# Altium footprint library FPC_FFC_Connectors.PcbLib: 27 footprints (part 2 of 2)
Each footprint in its own frame and in the unit in brackets; x right, y up, seen from the top. Pads: shape width x height; smd on the part's side, far side on the other; paste and mask are expansions set on the pad; w line width, h text height; cw(c..) or ccw(c..) is an arc to the next point about the centre after c.
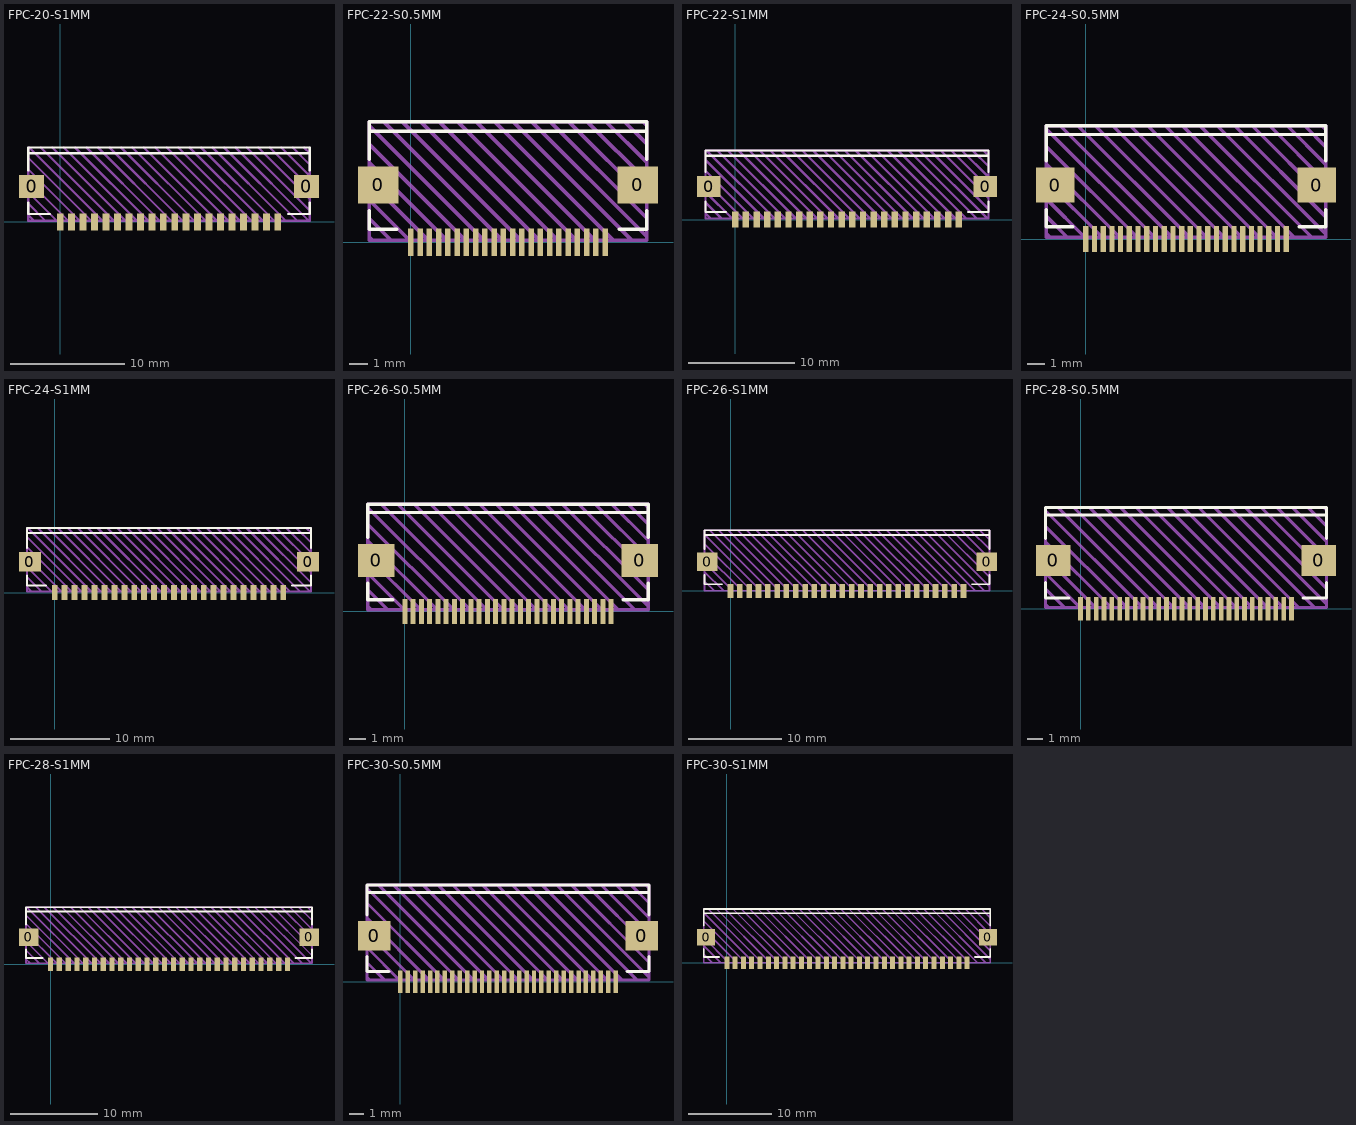
[diagram p1: the footprints below, top view; thin cyan lines are the x and y axes]

## FPC-20-S1MM [mm]
pads (22):
  rect 2.2x2 smd: 0(-2.5,3.1) 0(21.5,3.1)
  rect 0.6x1.5 smd: 1(0,0) 2(1,0) 3(2,0) 4(3,0) 5(4,0) 6(5,0) 7(6,0) 8(7,0) 9(8,0) 10(9,0) 11(10,0) 12(11,0) 13(12,0) 14(13,0) 15(14,0) 16(15,0) 17(16,0) 18(17,0) 19(18,0) 20(19,0)
Top Overlay:
  lines w0.2: -2.8,1.7 -2.8,0.7 -0.9,0.7 ; -2.8,4.5 -2.8,6.5 21.8,6.5 21.8,4.5 ; -2.8,6 21.8,6 ; 19.9,0.7 21.8,0.7 21.8,1.7
Top Draw:
  lines w0.2: -2.8,0.6 -2.3,0.1 ; -2.8,1.6 -1.3,0.1 ; -2.8,2.6 -0.3,0.1 ; -2.8,3.6 0.7,0.1 ; -2.8,4.6 1.7,0.1 ; -2.8,5.6 2.7,0.1 ; -2.8,6.5 -2.8,0.1 21.8,0.1 21.8,6.5 ; -2.7,6.5 3.7,0.1 ; -1.7,6.5 4.7,0.1 ; -0.7,6.5 5.7,0.1 ; 0.3,6.5 6.7,0.1 ; 1.3,6.5 7.7,0.1 ; 2.3,6.5 8.7,0.1 ; 3.3,6.5 9.7,0.1 ; 4.3,6.5 10.7,0.1 ; 5.3,6.5 11.7,0.1 ; 6.3,6.5 12.7,0.1 ; 7.3,6.5 13.7,0.1 ; 8.3,6.5 14.7,0.1 ; 9.3,6.5 15.7,0.1 ; 10.3,6.5 16.7,0.1 ; 11.3,6.5 17.7,0.1 ; 12.3,6.5 18.7,0.1 ; 13.3,6.5 19.7,0.1 ; 14.3,6.5 20.7,0.1 ; 15.3,6.5 21.7,0.1 ; 16.3,6.5 21.8,1 ; 17.3,6.5 21.8,2 ; 18.3,6.5 21.8,3 ; 19.3,6.5 21.8,4 ; 20.3,6.5 21.8,5 ; 21.3,6.5 21.8,6
Top Info:
  text "'.Comment'" at 5.251,-2.283 h1
3D body "686120148922 (rev1).stp": height 2.25, standoff 0, extent -2.8,0.05 21.8,6.55

## FPC-22-S0.5MM [mm]
pads (24):
  rect 2.2x2 smd: 0(-1.75,3.1) 0(12.25,3.1)
  rect 0.3x1.5 smd: 1(0,0) 2(0.5,0) 3(1,0) 4(1.5,0) 5(2,0) 6(2.5,0) 7(3,0) 8(3.5,0) 9(4,0) 10(4.5,0) 11(5,0) 12(5.5,0) 13(6,0) 14(6.5,0) 15(7,0) 16(7.5,0) 17(8,0) 18(8.5,0) 19(9,0) 20(9.5,0) 21(10,0) 22(10.5,0)
Top Overlay:
  lines w0.2: -2.25,1.7 -2.25,0.7 -0.75,0.7 ; -2.25,4.5 -2.25,6.5 12.75,6.5 12.75,4.5 ; -2.25,6 12.75,6 ; 11.25,0.7 12.75,0.7 12.75,1.7
Top Draw:
  lines w0.2: -2.25,0.3 -2.05,0.1 ; -2.25,1.3 -1.05,0.1 ; -2.25,2.3 -0.05,0.1 ; -2.25,3.3 0.95,0.1 ; -2.25,4.3 1.95,0.1 ; -2.25,5.3 2.95,0.1 ; -2.25,6.3 3.95,0.1 ; -1.45,6.5 4.95,0.1 ; -0.45,6.5 5.95,0.1 ; 0.55,6.5 6.95,0.1 ; 1.55,6.5 7.95,0.1 ; 2.55,6.5 8.95,0.1 ; 3.55,6.5 9.95,0.1 ; 4.55,6.5 10.95,0.1 ; 5.55,6.5 11.95,0.1 ; 6.55,6.5 12.75,0.3 ; 7.55,6.5 12.75,1.3 ; 8.55,6.5 12.75,2.3 ; 9.55,6.5 12.75,3.3 ; 10.55,6.5 12.75,4.3 ; 11.55,6.5 12.75,5.3 ; 12.55,6.5 12.75,6.3 ; -2.25,0.1 -2.25,6.5 12.75,6.5 12.75,0.1 -2.25,0.1
Top Info:
  text "'.Comment'" at 1.001,-2.283 h1
3D body "687122149022 (rev1).stp": height 2.25, standoff 0, extent -2.3,0.05 12.8,6.55

## FPC-22-S1MM [mm]
pads (24):
  rect 2.2x2 smd: 0(-2.5,3.1) 0(23.5,3.1)
  rect 0.6x1.5 smd: 1(0,0) 2(1,0) 3(2,0) 4(3,0) 5(4,0) 6(5,0) 7(6,0) 8(7,0) 9(8,0) 10(9,0) 11(10,0) 12(11,0) 13(12,0) 14(13,0) 15(14,0) 16(15,0) 17(16,0) 18(17,0) 19(18,0) 20(19,0) 21(20,0) 22(21,0)
Top Overlay:
  lines w0.2: -2.8,1.7 -2.8,0.7 -0.9,0.7 ; -2.8,4.5 -2.8,6.5 23.8,6.5 23.8,4.5 ; -2.8,6 23.8,6 ; 21.9,0.7 23.8,0.7 23.8,1.7
Top Draw:
  lines w0.2: -2.8,0.6 -2.3,0.1 ; -2.8,1.6 -1.3,0.1 ; -2.8,2.6 -0.3,0.1 ; -2.8,3.6 0.7,0.1 ; -2.8,4.6 1.7,0.1 ; -2.8,5.6 2.7,0.1 ; -2.7,6.5 3.7,0.1 ; -1.7,6.5 4.7,0.1 ; -0.7,6.5 5.7,0.1 ; 0.3,6.5 6.7,0.1 ; 1.3,6.5 7.7,0.1 ; 2.3,6.5 8.7,0.1 ; 3.3,6.5 9.7,0.1 ; 4.3,6.5 10.7,0.1 ; 5.3,6.5 11.7,0.1 ; 6.3,6.5 12.7,0.1 ; 7.3,6.5 13.7,0.1 ; 8.3,6.5 14.7,0.1 ; 9.3,6.5 15.7,0.1 ; 10.3,6.5 16.7,0.1 ; 11.3,6.5 17.7,0.1 ; 12.3,6.5 18.7,0.1 ; 13.3,6.5 19.7,0.1 ; 14.3,6.5 20.7,0.1 ; 15.3,6.5 21.7,0.1 ; 16.3,6.5 22.7,0.1 ; 17.3,6.5 23.7,0.1 ; 18.3,6.5 23.8,1 ; 19.3,6.5 23.8,2 ; 20.3,6.5 23.8,3 ; 21.3,6.5 23.8,4 ; 22.3,6.5 23.8,5 ; 23.3,6.5 23.8,6 ; -2.8,0.1 23.8,0.1 23.8,6.5 -2.8,6.5 -2.8,0.1
Top Info:
  text "'.Comment'" at 6.251,-2.283 h1
3D body "686122148922 (rev1).stp": height 2.25, standoff 0, extent -2.8,0.05 23.8,6.55

## FPC-24-S0.5MM [mm]
pads (26):
  rect 2.2x2 smd: 0(-1.75,3.1) 0(13.25,3.1)
  rect 0.3x1.5 smd: 1(0,0) 2(0.5,0) 3(1,0) 4(1.5,0) 5(2,0) 6(2.5,0) 7(3,0) 8(3.5,0) 9(4,0) 10(4.5,0) 11(5,0) 12(5.5,0) 13(6,0) 14(6.5,0) 15(7,0) 16(7.5,0) 17(8,0) 18(8.5,0) 19(9,0) 20(9.5,0) 21(10,0) 22(10.5,0) 23(11,0) 24(11.5,0)
Top Overlay:
  lines w0.2: -2.25,1.7 -2.25,0.7 -0.75,0.7 ; -2.25,4.5 -2.25,6.5 13.75,6.5 13.75,4.5 ; -2.25,6 13.75,6 ; 12.25,0.7 13.75,0.7 13.75,1.7
Top Draw:
  lines w0.2: -2.25,0.3 -2.05,0.1 ; -2.25,1.3 -1.05,0.1 ; -2.25,2.3 -0.05,0.1 ; -2.25,3.3 0.95,0.1 ; -2.25,4.3 1.95,0.1 ; -2.25,5.3 2.95,0.1 ; -2.25,6.3 3.95,0.1 ; -1.45,6.5 4.95,0.1 ; -0.45,6.5 5.95,0.1 ; 0.55,6.5 6.95,0.1 ; 1.55,6.5 7.95,0.1 ; 2.55,6.5 8.95,0.1 ; 3.55,6.5 9.95,0.1 ; 4.55,6.5 10.95,0.1 ; 5.55,6.5 11.95,0.1 ; 6.55,6.5 12.95,0.1 ; 7.55,6.5 13.75,0.3 ; 8.55,6.5 13.75,1.3 ; 9.55,6.5 13.75,2.3 ; 10.55,6.5 13.75,3.3 ; 11.55,6.5 13.75,4.3 ; 12.55,6.5 13.75,5.3 ; 13.55,6.5 13.75,6.3 ; -2.25,0.1 -2.25,6.5 13.75,6.5 13.75,0.1 -2.25,0.1
Top Info:
  text "'.Comment'" at 1.501,-2.283 h1
3D body "687124149022 (rev1).stp": height 2.25, standoff 0, extent -2.3,0.05 13.8,6.55

## FPC-24-S1MM [mm]
pads (26):
  rect 2.2x2 smd: 0(-2.5,3.1) 0(25.5,3.1)
  rect 0.6x1.5 smd: 1(0,0) 2(1,0) 3(2,0) 4(3,0) 5(4,0) 6(5,0) 7(6,0) 8(7,0) 9(8,0) 10(9,0) 11(10,0) 12(11,0) 13(12,0) 14(13,0) 15(14,0) 16(15,0) 17(16,0) 18(17,0) 19(18,0) 20(19,0) 21(20,0) 22(21,0) 23(22,0) 24(23,0)
Top Overlay:
  lines w0.2: -2.8,1.7 -2.8,0.7 -0.9,0.7 ; -2.8,4.5 -2.8,6.5 25.8,6.5 25.8,4.5 ; -2.8,6 25.8,6 ; 23.9,0.7 25.8,0.7 25.8,1.7
Top Draw:
  lines w0.2: -2.8,0.6 -2.3,0.1 ; -2.8,1.6 -1.3,0.1 ; -2.8,2.6 -0.3,0.1 ; -2.8,3.6 0.7,0.1 ; -2.8,4.6 1.7,0.1 ; -2.8,5.6 2.7,0.1 ; -2.7,6.5 3.7,0.1 ; -1.7,6.5 4.7,0.1 ; -0.7,6.5 5.7,0.1 ; 0.3,6.5 6.7,0.1 ; 1.3,6.5 7.7,0.1 ; 2.3,6.5 8.7,0.1 ; 3.3,6.5 9.7,0.1 ; 4.3,6.5 10.7,0.1 ; 5.3,6.5 11.7,0.1 ; 6.3,6.5 12.7,0.1 ; 7.3,6.5 13.7,0.1 ; 8.3,6.5 14.7,0.1 ; 9.3,6.5 15.7,0.1 ; 10.3,6.5 16.7,0.1 ; 11.3,6.5 17.7,0.1 ; 12.3,6.5 18.7,0.1 ; 13.3,6.5 19.7,0.1 ; 14.3,6.5 20.7,0.1 ; 15.3,6.5 21.7,0.1 ; 16.3,6.5 22.7,0.1 ; 17.3,6.5 23.7,0.1 ; 18.3,6.5 24.7,0.1 ; 19.3,6.5 25.7,0.1 ; 20.3,6.5 25.8,1 ; 21.3,6.5 25.8,2 ; 22.3,6.5 25.8,3 ; 23.3,6.5 25.8,4 ; 24.3,6.5 25.8,5 ; 25.3,6.5 25.8,6 ; -2.8,0.1 -2.8,6.5 25.8,6.5 25.8,0.1 -2.8,0.1
Top Info:
  text "'.Comment'" at 7.251,-2.283 h1
3D body "686124148922 (rev1).stp": height 2.25, standoff 0, extent -2.8,0.05 25.8,6.55

## FPC-26-S0.5MM [mm]
pads (28):
  rect 2.2x2 smd: 0(-1.75,3.1) 0(14.25,3.1)
  rect 0.3x1.5 smd: 1(0,0) 2(0.5,0) 3(1,0) 4(1.5,0) 5(2,0) 6(2.5,0) 7(3,0) 8(3.5,0) 9(4,0) 10(4.5,0) 11(5,0) 12(5.5,0) 13(6,0) 14(6.5,0) 15(7,0) 16(7.5,0) 17(8,0) 18(8.5,0) 19(9,0) 20(9.5,0) 21(10,0) 22(10.5,0) 23(11,0) 24(11.5,0) 25(12,0) 26(12.5,0)
Top Overlay:
  lines w0.2: -2.25,1.7 -2.25,0.7 -0.75,0.7 ; -2.25,4.5 -2.25,6.5 14.75,6.5 14.75,4.5 ; -2.25,6 14.75,6 ; 13.25,0.7 14.75,0.7 14.75,1.7
Top Draw:
  lines w0.2: -2.25,0.3 -2.05,0.1 ; -2.25,1.3 -1.05,0.1 ; -2.25,2.3 -0.05,0.1 ; -2.25,3.3 0.95,0.1 ; -2.25,4.3 1.95,0.1 ; -2.25,5.3 2.95,0.1 ; -2.25,6.3 3.95,0.1 ; -1.45,6.5 4.95,0.1 ; -0.45,6.5 5.95,0.1 ; 0.55,6.5 6.95,0.1 ; 1.55,6.5 7.95,0.1 ; 2.55,6.5 8.95,0.1 ; 3.55,6.5 9.95,0.1 ; 4.55,6.5 10.95,0.1 ; 5.55,6.5 11.95,0.1 ; 6.55,6.5 12.95,0.1 ; 7.55,6.5 13.95,0.1 ; 8.55,6.5 14.75,0.3 ; 9.55,6.5 14.75,1.3 ; 10.55,6.5 14.75,2.3 ; 11.55,6.5 14.75,3.3 ; 12.55,6.5 14.75,4.3 ; 13.55,6.5 14.75,5.3 ; 14.55,6.5 14.75,6.3 ; -2.25,0.1 -2.25,6.5 14.75,6.5 14.75,0.1 -2.25,0.1
Top Info:
  text "'.Comment'" at 2.001,-2.283 h1
3D body "687126149022 (rev1).stp": height 2.25, standoff 0, extent -2.3,0.05 14.8,6.55

## FPC-26-S1MM [mm]
pads (28):
  rect 2.2x2 smd: 0(-2.5,3.1) 0(27.5,3.1)
  rect 0.6x1.5 smd: 1(0,0) 2(1,0) 3(2,0) 4(3,0) 5(4,0) 6(5,0) 7(6,0) 8(7,0) 9(8,0) 10(9,0) 11(10,0) 12(11,0) 13(12,0) 14(13,0) 15(14,0) 16(15,0) 17(16,0) 18(17,0) 19(18,0) 20(19,0) 21(20,0) 22(21,0) 23(22,0) 24(23,0) 25(24,0) 26(25,0)
Top Overlay:
  lines w0.2: -2.8,1.7 -2.8,0.7 -0.9,0.7 ; -2.8,4.5 -2.8,6.5 27.8,6.5 27.8,4.5 ; -2.8,6 27.8,6 ; 25.9,0.7 27.8,0.7 27.8,1.7
Top Draw:
  lines w0.2: -2.8,0.05 -2.75,0 ; -2.8,1.05 -1.75,0 ; -2.8,2.05 -0.75,0 ; -2.8,3.05 0.25,0 ; -2.8,4.05 1.25,0 ; -2.8,5.05 2.25,0 ; -2.8,6.05 3.25,0 ; -2.25,6.5 4.25,0 ; -1.25,6.5 5.25,0 ; -0.25,6.5 6.25,0 ; 0.75,6.5 7.25,0 ; 1.75,6.5 8.25,0 ; 2.75,6.5 9.25,0 ; 3.75,6.5 10.25,0 ; 4.75,6.5 11.25,0 ; 5.75,6.5 12.25,0 ; 6.75,6.5 13.25,0 ; 7.75,6.5 14.25,0 ; 8.75,6.5 15.25,0 ; 9.75,6.5 16.25,0 ; 10.75,6.5 17.25,0 ; 11.75,6.5 18.25,0 ; 12.75,6.5 19.25,0 ; 13.75,6.5 20.25,0 ; 14.75,6.5 21.25,0 ; 15.75,6.5 22.25,0 ; 16.75,6.5 23.25,0 ; 17.75,6.5 24.25,0 ; 18.75,6.5 25.25,0 ; 19.75,6.5 26.25,0 ; 20.75,6.5 27.25,0 ; 21.75,6.5 27.8,0.45 ; 22.75,6.5 27.8,1.45 ; 23.75,6.5 27.8,2.45 ; 24.75,6.5 27.8,3.45 ; 25.75,6.5 27.8,4.45 ; 26.75,6.5 27.8,5.45 ; 27.75,6.5 27.8,6.45 ; -2.8,0 27.8,0 27.8,6.5 -2.8,6.5 -2.8,0
Top Info:
  text "'.Comment'" at 8.251,-2.283 h1
3D body "686126148922 (rev1).stp": height 2.25, standoff 0, extent -2.8,-0.05 27.8,6.45

## FPC-28-S0.5MM [mm]
pads (30):
  rect 2.2x2 smd: 0(-1.75,3.1) 0(15.25,3.1)
  rect 0.3x1.5 smd: 1(0,0) 2(0.5,0) 3(1,0) 4(1.5,0) 5(2,0) 6(2.5,0) 7(3,0) 8(3.5,0) 9(4,0) 10(4.5,0) 11(5,0) 12(5.5,0) 13(6,0) 14(6.5,0) 15(7,0) 16(7.5,0) 17(8,0) 18(8.5,0) 19(9,0) 20(9.5,0) 21(10,0) 22(10.5,0) 23(11,0) 24(11.5,0) 25(12,0) 26(12.5,0) 27(13,0) 28(13.5,0)
Top Overlay:
  lines w0.2: -2.25,1.7 -2.25,0.7 -0.75,0.7 ; -2.25,4.5 -2.25,6.5 15.75,6.5 15.75,4.5 ; -2.25,6 15.75,6 ; 14.25,0.7 15.75,0.7 15.75,1.7
Top Draw:
  lines w0.2: -2.25,0.3 -2.05,0.1 ; -2.25,1.3 -1.05,0.1 ; -2.25,2.3 -0.05,0.1 ; -2.25,3.3 0.95,0.1 ; -2.25,4.3 1.95,0.1 ; -2.25,5.3 2.95,0.1 ; -2.25,6.3 3.95,0.1 ; -1.45,6.5 4.95,0.1 ; -0.45,6.5 5.95,0.1 ; 0.55,6.5 6.95,0.1 ; 1.55,6.5 7.95,0.1 ; 2.55,6.5 8.95,0.1 ; 3.55,6.5 9.95,0.1 ; 4.55,6.5 10.95,0.1 ; 5.55,6.5 11.95,0.1 ; 6.55,6.5 12.95,0.1 ; 7.55,6.5 13.95,0.1 ; 8.55,6.5 14.95,0.1 ; 9.55,6.5 15.75,0.3 ; 10.55,6.5 15.75,1.3 ; 11.55,6.5 15.75,2.3 ; 12.55,6.5 15.75,3.3 ; 13.55,6.5 15.75,4.3 ; 14.55,6.5 15.75,5.3 ; 15.55,6.5 15.75,6.3 ; -2.25,0.1 15.75,0.1 15.75,6.5 -2.25,6.5 -2.25,0.1
Top Info:
  text "'.Comment'" at 2.501,-2.283 h1
3D body "687128149022 (rev1).stp": height 2.25, standoff 0, extent -2.3,0.05 15.8,6.55

## FPC-28-S1MM [mm]
pads (30):
  rect 2.2x2 smd: 0(-2.5,3.1) 0(29.5,3.1)
  rect 0.6x1.5 smd: 1(0,0) 2(1,0) 3(2,0) 4(3,0) 5(4,0) 6(5,0) 7(6,0) 8(7,0) 9(8,0) 10(9,0) 11(10,0) 12(11,0) 13(12,0) 14(13,0) 15(14,0) 16(15,0) 17(16,0) 18(17,0) 19(18,0) 20(19,0) 21(20,0) 22(21,0) 23(22,0) 24(23,0) 25(24,0) 26(25,0) 27(26,0) 28(27,0)
Top Overlay:
  lines w0.2: -2.8,1.7 -2.8,0.7 -0.9,0.7 ; -2.8,4.5 -2.8,6.5 29.8,6.5 29.8,4.5 ; -2.8,6 29.8,6 ; 27.9,0.7 29.8,0.7 29.8,1.7
Top Draw:
  lines w0.2: -2.8,0.6 -2.3,0.1 ; -2.8,1.6 -1.3,0.1 ; -2.8,2.6 -0.3,0.1 ; -2.8,3.6 0.7,0.1 ; -2.8,4.6 1.7,0.1 ; -2.8,5.6 2.7,0.1 ; -2.7,6.5 3.7,0.1 ; -1.7,6.5 4.7,0.1 ; -0.7,6.5 5.7,0.1 ; 0.3,6.5 6.7,0.1 ; 1.3,6.5 7.7,0.1 ; 2.3,6.5 8.7,0.1 ; 3.3,6.5 9.7,0.1 ; 4.3,6.5 10.7,0.1 ; 5.3,6.5 11.7,0.1 ; 6.3,6.5 12.7,0.1 ; 7.3,6.5 13.7,0.1 ; 8.3,6.5 14.7,0.1 ; 9.3,6.5 15.7,0.1 ; 10.3,6.5 16.7,0.1 ; 11.3,6.5 17.7,0.1 ; 12.3,6.5 18.7,0.1 ; 13.3,6.5 19.7,0.1 ; 14.3,6.5 20.7,0.1 ; 15.3,6.5 21.7,0.1 ; 16.3,6.5 22.7,0.1 ; 17.3,6.5 23.7,0.1 ; 18.3,6.5 24.7,0.1 ; 19.3,6.5 25.7,0.1 ; 20.3,6.5 26.7,0.1 ; 21.3,6.5 27.7,0.1 ; 22.3,6.5 28.7,0.1 ; 23.3,6.5 29.7,0.1 ; 24.3,6.5 29.8,1 ; 25.3,6.5 29.8,2 ; 26.3,6.5 29.8,3 ; 27.3,6.5 29.8,4 ; 28.3,6.5 29.8,5 ; 29.3,6.5 29.8,6 ; -2.8,0.1 -2.8,6.5 29.8,6.5 29.8,0.1 -2.8,0.1
Top Info:
  text "'.Comment'" at 9.251,-2.283 h1
3D body "686128148922 (rev1).stp": height 2.25, standoff 0, extent -2.8,0.05 29.8,6.55

## FPC-30-S0.5MM [mm]
pads (32):
  rect 2.2x2 smd: 0(-1.75,3.1) 0(16.25,3.1)
  rect 0.3x1.5 smd: 1(0,0) 2(0.5,0) 3(1,0) 4(1.5,0) 5(2,0) 6(2.5,0) 7(3,0) 8(3.5,0) 9(4,0) 10(4.5,0) 11(5,0) 12(5.5,0) 13(6,0) 14(6.5,0) 15(7,0) 16(7.5,0) 17(8,0) 18(8.5,0) 19(9,0) 20(9.5,0) 21(10,0) 22(10.5,0) 23(11,0) 24(11.5,0) 25(12,0) 26(12.5,0) 27(13,0) 28(13.5,0) 29(14,0) 30(14.5,0)
Top Overlay:
  lines w0.2: -2.25,1.7 -2.25,0.7 -0.75,0.7 ; -2.25,4.5 -2.25,6.5 16.75,6.5 16.75,4.5 ; -2.25,6 16.75,6 ; 15.25,0.7 16.75,0.7 16.75,1.7
Top Draw:
  lines w0.2: -2.25,0.3 -2.05,0.1 ; -2.25,1.3 -1.05,0.1 ; -2.25,2.3 -0.05,0.1 ; -2.25,3.3 0.95,0.1 ; -2.25,4.3 1.95,0.1 ; -2.25,5.3 2.95,0.1 ; -2.25,6.3 3.95,0.1 ; -1.45,6.5 4.95,0.1 ; -0.45,6.5 5.95,0.1 ; 0.55,6.5 6.95,0.1 ; 1.55,6.5 7.95,0.1 ; 2.55,6.5 8.95,0.1 ; 3.55,6.5 9.95,0.1 ; 4.55,6.5 10.95,0.1 ; 5.55,6.5 11.95,0.1 ; 6.55,6.5 12.95,0.1 ; 7.55,6.5 13.95,0.1 ; 8.55,6.5 14.95,0.1 ; 9.55,6.5 15.95,0.1 ; 10.55,6.5 16.75,0.3 ; 11.55,6.5 16.75,1.3 ; 12.55,6.5 16.75,2.3 ; 13.55,6.5 16.75,3.3 ; 14.55,6.5 16.75,4.3 ; 15.55,6.5 16.75,5.3 ; 16.55,6.5 16.75,6.3 ; -2.25,0.1 -2.25,6.5 16.75,6.5 16.75,0.1 -2.25,0.1
Top Info:
  text "'.Comment'" at 3.001,-2.283 h1
3D body "687130149022 (rev1).stp": height 2.25, standoff 0, extent -2.3,0.05 16.8,6.55

## FPC-30-S1MM [mm]
pads (32):
  rect 2.2x2 smd: 0(-2.5,3.1) 0(31.5,3.1)
  rect 0.6x1.5 smd: 1(0,0) 2(1,0) 3(2,0) 4(3,0) 5(4,0) 6(5,0) 7(6,0) 8(7,0) 9(8,0) 10(9,0) 11(10,0) 12(11,0) 13(12,0) 14(13,0) 15(14,0) 16(15,0) 17(16,0) 18(17,0) 19(18,0) 20(19,0) 21(20,0) 22(21,0) 23(22,0) 24(23,0) 25(24,0) 26(25,0) 27(26,0) 28(27,0) 29(28,0) 30(29,0)
Top Overlay:
  lines w0.2: -2.8,1.7 -2.8,0.7 -0.9,0.7 ; -2.8,4.5 -2.8,6.5 31.8,6.5 31.8,4.5 ; -2.8,6 31.8,6 ; 29.9,0.7 31.8,0.7 31.8,1.7
Top Draw:
  lines w0.2: -2.8,0.05 -2.75,0 ; -2.8,1.05 -1.75,0 ; -2.8,2.05 -0.75,0 ; -2.8,3.05 0.25,0 ; -2.8,4.05 1.25,0 ; -2.8,5.05 2.25,0 ; -2.8,6.05 3.25,0 ; -2.25,6.5 4.25,0 ; -1.25,6.5 5.25,0 ; -0.25,6.5 6.25,0 ; 0.75,6.5 7.25,0 ; 1.75,6.5 8.25,0 ; 2.75,6.5 9.25,0 ; 3.75,6.5 10.25,0 ; 4.75,6.5 11.25,0 ; 5.75,6.5 12.25,0 ; 6.75,6.5 13.25,0 ; 7.75,6.5 14.25,0 ; 8.75,6.5 15.25,0 ; 9.75,6.5 16.25,0 ; 10.75,6.5 17.25,0 ; 11.75,6.5 18.25,0 ; 12.75,6.5 19.25,0 ; 13.75,6.5 20.25,0 ; 14.75,6.5 21.25,0 ; 15.75,6.5 22.25,0 ; 16.75,6.5 23.25,0 ; 17.75,6.5 24.25,0 ; 18.75,6.5 25.25,0 ; 19.75,6.5 26.25,0 ; 20.75,6.5 27.25,0 ; 21.75,6.5 28.25,0 ; 22.75,6.5 29.25,0 ; 23.75,6.5 30.25,0 ; 24.75,6.5 31.25,0 ; 25.75,6.5 31.8,0.45 ; 26.75,6.5 31.8,1.45 ; 27.75,6.5 31.8,2.45 ; 28.75,6.5 31.8,3.45 ; 29.75,6.5 31.8,4.45 ; 30.75,6.5 31.8,5.45 ; 31.75,6.5 31.8,6.45 ; -2.8,0 31.8,0 31.8,6.5 -2.8,6.5 -2.8,0
Top Info:
  text "'.Comment'" at 10.251,-2.283 h1
3D body "686130148922 (rev1).stp": height 2.25, standoff 0, extent -2.8,-0.05 31.8,6.45